# Altium footprint library 集大电协1.5.PcbLib: 273 footprints (part 12 of 18)
Each footprint in its own frame and in the unit in brackets; x right, y up, seen from the top. Pads: shape width x height; smd on the part's side, far side on the other; paste and mask are expansions set on the pad; w line width, h text height; cw(c..) or ccw(c..) is an arc to the next point about the centre after c.
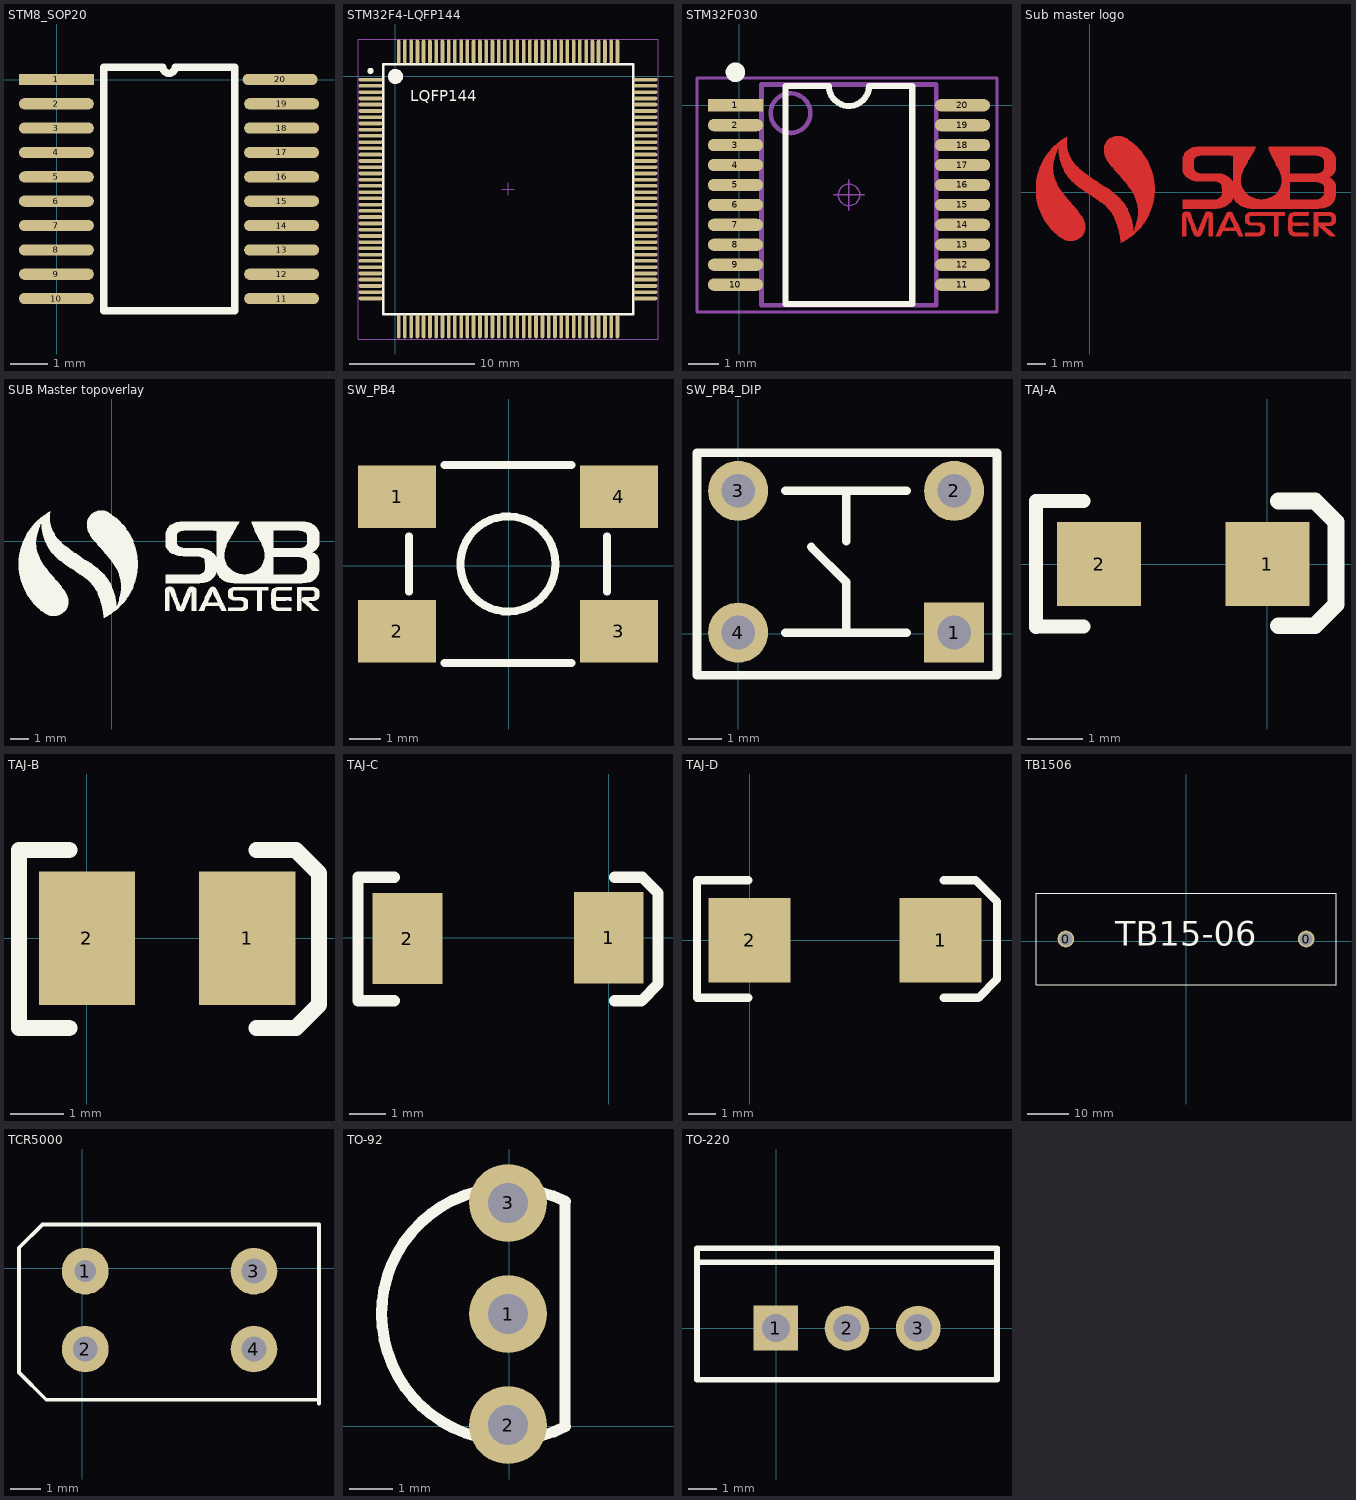
[diagram p11: the footprints below, top view; thin cyan lines are the x and y axes]

## STM8_SOP20 [mm]
pads (20):
  rect 2x0.3 smd: 1(-0.014,0.005)
  oval 2x0.3 smd: 2(-0.014,-0.645) 3(-0.014,-1.295) 4(-0.014,-1.945) 5(-0.014,-2.595) 6(-0.014,-3.245) 7(-0.014,-3.895) 8(-0.014,-4.545) 9(-0.014,-5.195) 10(-0.014,-5.845) 11(5.994,-5.845) 12(5.994,-5.195) 13(5.994,-4.545) 14(5.994,-3.895) 15(5.994,-3.245) 16(5.994,-2.595) 17(5.994,-1.945) 18(5.994,-1.295) 19(5.994,-0.645) 20(5.955,0.005)
Top Overlay:
  lines w0.2: 1.245,-6.17 4.75,-6.17 4.75,0.33 3.153,0.33 cw(c2.99,0.33) 2.828,0.33 1.245,0.33 1.245,-6.17
3D body: height 1.1, standoff -0.09, extent -0.159,-6.273 6.121,0.227

## STM32F4-LQFP144 [mm]
pads (144):
  oval 1.905x0.3 smd: 1(-1.98,-0.262) 2(-1.98,-0.762) 3(-1.98,-1.262) 4(-1.98,-1.762) 5(-1.98,-2.262) 6(-1.98,-2.762) 7(-1.98,-3.262) 8(-1.98,-3.762) 9(-1.98,-4.262) 10(-1.98,-4.762) 11(-1.98,-5.262) 12(-1.98,-5.762) 13(-1.98,-6.262) 14(-1.98,-6.762) 15(-1.98,-7.262) 16(-1.98,-7.762) 17(-1.98,-8.262) 18(-1.98,-8.762) 19(-1.98,-9.262) 20(-1.98,-9.762) 21(-1.98,-10.262) 22(-1.98,-10.762) 23(-1.98,-11.262) 24(-1.98,-11.762) 25(-1.98,-12.262) 26(-1.98,-12.762) 27(-1.98,-13.262) 28(-1.98,-13.762) 29(-1.98,-14.262) 30(-1.98,-14.762) 31(-1.98,-15.262) 32(-1.98,-15.762) 33(-1.98,-16.262) 34(-1.98,-16.762) 35(-1.98,-17.262) 36(-1.98,-17.762) 73(20.02,-17.762) 74(20.02,-17.262) 75(20.02,-16.762) 76(20.02,-16.262) 77(20.02,-15.762) 78(20.02,-15.262) 79(20.02,-14.762) 80(20.02,-14.262) 81(20.02,-13.762) 82(20.02,-13.262) 83(20.02,-12.762) 84(20.02,-12.262) 85(20.02,-11.762) 86(20.02,-11.262) 87(20.02,-10.762) 88(20.02,-10.262) 89(20.02,-9.762) 90(20.02,-9.262) 91(20.02,-8.762) 92(20.02,-8.262) 93(20.02,-7.762) 94(20.02,-7.262) 95(20.02,-6.762) 96(20.02,-6.262) 97(20.02,-5.762) 98(20.02,-5.262) 99(20.02,-4.762) 100(20.02,-4.262) 101(20.02,-3.762) 102(20.02,-3.262) 103(20.02,-2.762) 104(20.02,-2.262) 105(20.02,-1.762) 106(20.02,-1.262) 107(20.02,-0.762) 108(20.02,-0.262)
  oval 0.3x1.905 smd: 37(0.27,-20.012) 38(0.77,-20.012) 39(1.27,-20.012) 40(1.77,-20.012) 41(2.27,-20.012) 42(2.77,-20.012) 43(3.27,-20.012) 44(3.77,-20.012) 45(4.27,-20.012) 46(4.77,-20.012) 47(5.27,-20.012) 48(5.77,-20.012) 49(6.27,-20.012) 50(6.77,-20.012) 51(7.27,-20.012) 52(7.77,-20.012) 53(8.27,-20.012) 54(8.77,-20.012) 55(9.27,-20.012) 56(9.77,-20.012) 57(10.27,-20.012) 58(10.77,-20.012) 59(11.27,-20.012) 60(11.77,-20.012) 61(12.27,-20.012) 62(12.77,-20.012) 63(13.27,-20.012) 64(13.77,-20.012) 65(14.27,-20.012) 66(14.77,-20.012) 67(15.27,-20.012) 68(15.77,-20.012) 69(16.27,-20.012) 70(16.77,-20.012) 71(17.27,-20.012) 72(17.77,-20.012) 109(17.77,1.988) 110(17.27,1.988) 111(16.77,1.988) 112(16.27,1.988) 113(15.77,1.988) 114(15.27,1.988) 115(14.77,1.988) 116(14.27,1.988) 117(13.77,1.988) 118(13.27,1.988) 119(12.77,1.988) 120(12.27,1.988) 121(11.77,1.988) 122(11.27,1.988) 123(10.77,1.988) 124(10.27,1.988) 125(9.77,1.988) 126(9.27,1.988) 127(8.77,1.988) 128(8.27,1.988) 129(7.77,1.988) 130(7.27,1.988) 131(6.77,1.988) 132(6.27,1.988) 133(5.77,1.988) 134(5.27,1.988) 135(4.77,1.988) 136(4.27,1.988) 137(3.77,1.988) 138(3.27,1.988) 139(2.77,1.988) 140(2.27,1.988) 141(1.77,1.988) 142(1.27,1.988) 143(0.77,1.988) 144(0.27,1.988)
Top Overlay:
  circle w0.6: c0.02,-0.012 r0.3
  circle w0.25: c-1.98,0.438 r0.125
  lines w0.2: -0.98,-19.012 19.02,-19.012 19.02,0.988 -0.98,0.988 -0.98,-19.012
  text "LQFP144" at 1.2,-2.3 h1.52
Mechanical 13:
  circle w0.1: c-0.03,0.038 r0.5
  lines w0.1: -0.98,-19.012 19.02,-19.012 19.02,0.988 -0.98,0.988 -0.98,-19.012
Mechanical 15:
  lines w0.1: 8.52,-9.012 9.52,-9.012 ; 9.02,-9.512 9.02,-8.512 ; -2.98,-21.012 21.02,-21.012 21.02,2.988 -2.98,2.988 -2.98,-21.012
3D body: height 1.6, standoff 0.25, extent -0.98,-19.012 19.02,0.988

## STM32F030 [mm]
pads (20):
  rect 1.8x0.4 smd: 1(-0.119,0.004)
  oval 1.8x0.4 smd: 2(-0.119,-0.646) 3(-0.119,-1.296) 4(-0.119,-1.946) 5(-0.119,-2.596) 6(-0.119,-3.246) 7(-0.119,-3.896) 8(-0.119,-4.546) 9(-0.119,-5.196) 10(-0.119,-5.846) 11(7.281,-5.846) 12(7.281,-5.196) 13(7.281,-4.546) 14(7.281,-3.896) 15(7.281,-3.246) 16(7.281,-2.596) 17(7.281,-1.946) 18(7.281,-1.296) 19(7.281,-0.646) 20(7.281,0.004)
Top Overlay:
  circle w0.381: c-0.119,1.079 r0.127
  lines w0.2: 1.516,-6.477 5.646,-6.477 5.646,0.635 4.237,0.635 cw(c3.581,0.635) 2.926,0.635 1.516,0.635 1.516,-6.477
Mechanical 13:
  circle w0.15: c1.676,-0.254 r0.648
  lines w0.15: 0.731,-6.521 6.431,-6.521 6.431,0.679 0.731,0.679 0.731,-6.521
Mechanical 15:
  circle w0.05: c3.581,-2.921 r0.35
  lines w0.05: 3.081,-2.921 4.081,-2.921 ; 3.581,-3.421 3.581,-2.421
  lines w0.1: -1.372,-6.731 8.407,-6.731 8.407,0.889 -1.372,0.889 -1.372,-6.731
3D body "SSOP20.STEP": height 1.65, standoff -0.03, extent -0.271,-6.521 7.434,0.679

## STM32F405RGT6 [mm] "STM32F405RGT6"

## Sub master logo [mm]
Top Layer:
  drawing of 1550 lines, arcs and shapes, not listed
Top Solder:
  drawing of 1550 lines, arcs and shapes, not listed

## SUB Master topoverlay [mm]
Top Overlay:
  drawing of 1550 lines, arcs and shapes, not listed

## SW_PB4 [mm]
pads (4):
  rect 2.5x2 smd: 1(-3.581,2.21) 2(-3.581,-2.108) 3(3.531,-2.108) 4(3.531,2.21)
Top Overlay:
  circle w0.254: c-0.025,0.051 r1.524
  lines w0.25: -3.2,-0.838 -3.2,0.94 ; -2.057,-3.124 2.007,-3.124 ; -2.057,3.226 2.007,3.226 ; 3.15,-0.838 3.15,0.94
3D body: height 6, standoff 0, extent -1.549,-1.473 1.499,1.575
3D body: height 1.5, standoff 0, extent -3.2,-3.124 3.15,3.226

## SW_PB4_DIP [mil]
pads (4):
  rect 70x70 hole 39.37: 1(251.98,1.32)
  round 70 hole 39.37: 2(251.98,166.68) 3(0.02,166.68) 4(0.02,1.32)
Top Overlay:
  lines w10: 55.13,1.32 196.87,1.32 ; 55.13,166.68 196.87,166.68 ; 85.06,101.32 126,60.38 126,1.32 ; 126,107.62 126,166.68 ; -48.02,-48.68 301.98,-48.68 301.98,211.32 -48.02,211.32 -48.02,-48.68
3D body: height 314.96, standoff -137.8, extent -37,-48.95 288.48,206.95

## TAJ-A [mil]
pads (2):
  rect 60x60 smd: 1(0,0) 2(-120,0)
Top Overlay:
  lines w10: -131,-44.51 -153.57,-44.51 -164.51,-44.51 -165,-45 -165,45 -131,45
  lines w12: 8,-44 34,-44 49,-29 49,30 34,45 8,45
3D body "C_case A.STEP": height 65, standoff 0.04, extent -124.81,-30.51 8.67,32.48

## TAJ-B [mm]
pads (2):
  rect 1.8x2.5 smd: 1(3,0) 2(0,0)
Top Overlay:
  lines w0.305: -0.33,-1.676 -1.27,-1.676 -1.27,-1.651 -1.27,-1.575 -1.27,1.651 -0.33,1.651 ; 3.175,-1.676 3.912,-1.676 4.343,-1.245 4.343,1.219 3.912,1.651 3.175,1.651
3D body "TAJ-B.STEP": height 1.9, standoff 0, extent -0.275,-1.4 3.225,1.4

## TAJ-C [mm]
pads (2):
  rect 1.905x2.5 smd: 1(0,0) 2(-5.505,-0.025)
Top Overlay:
  lines w0.305: -5.867,-1.727 -6.858,-1.727 -6.858,1.651 -5.867,1.651 ; 0.152,-1.727 0.889,-1.727 1.346,-1.27 1.346,1.219 0.914,1.651 0.152,1.651
3D body "TAJ-C.STEP": height 2.6, standoff 0, extent -5.775,-1.675 0.225,1.525

## TAJ-D [mm]
pads (2):
  rect 3x3.1 smd: 1(7,0) 2(0,0)
Top Overlay:
  lines w0.305: -0.051,-2.108 -1.93,-2.108 -1.93,2.21 -0.051,2.21 ; 7.112,-2.108 8.382,-2.108 9.068,-1.422 9.068,1.422 8.28,2.21 7.112,2.21
3D body "TAJ-D.STEP": height 2.9, standoff 0, extent -0.069,-2.125 7.231,2.175

## TB1506 [mm]
pads (2):
  round 4 hole 3.1: 0(-28.85,0.5) 0(28.65,0.5)
Top Overlay:
  lines w0.1: -36,-10.5 35.8,-10.5 35.8,11.5 -36,11.5 -36,-10.5
  text "TB15-06" at -17,-3 h10
3D body "User Library-Terminal block TB-1506.STEP": height 17, standoff 0, extent -36.6,-10.5 36.4,11.5

## TCR5000 [mil]
pads (4):
  round 60 hole 28 mask+0: 1(3.94,-3.54)
  round 60 hole 32 mask+0: 2(3.94,-103.54) 3(220.47,-3.54) 4(220.47,-103.54)
Top Overlay:
  lines w5: 303.94,-173.54 303.94,56.46 -51.06,56.46 -81.06,26.46 -81.06,-133.54 -46.06,-168.54 303.94,-168.54

## TO-92 [mil]
pads (3):
  round 70 hole 36: 1(-1,101) 2(-1,1) 3(-1,201)
Top Overlay:
  lines w10: 50.18,1 50.18,201.79 ; 50.5,202.42 ccw(c-1,101) 50.82,-0.26
3D body "TO-92(变形好).STEP": height 327.95, standoff -381.89, extent -101,-25 63.6,200.98

## TO-220 [mm]
pads (3):
  rect 1.6x1.6 hole 1: 1(-0.025,0)
  round 1.6 hole 1: 2(2.515,0) 3(5.055,0)
Top Overlay:
  lines w0.2: -2.835,2.35 7.865,2.35 ; -2.835,-1.85 -2.835,2.85 7.865,2.85 7.865,-1.85 -2.835,-1.85
3D body "SW3DPS-TO-220HS-DEFAULT.STEP": height 18.54, standoff -3.81, extent -2.54,-1.651 7.62,2.921